# Altium footprint library micro-intel.PCBLIB: 48 footprints (part 4 of 4)
Each footprint in its own frame and in the unit in brackets; x right, y up, seen from the top. Pads: shape width x height; smd on the part's side, far side on the other; paste and mask are expansions set on the pad; w line width, h text height; cw(c..) or ccw(c..) is an arc to the next point about the centre after c.
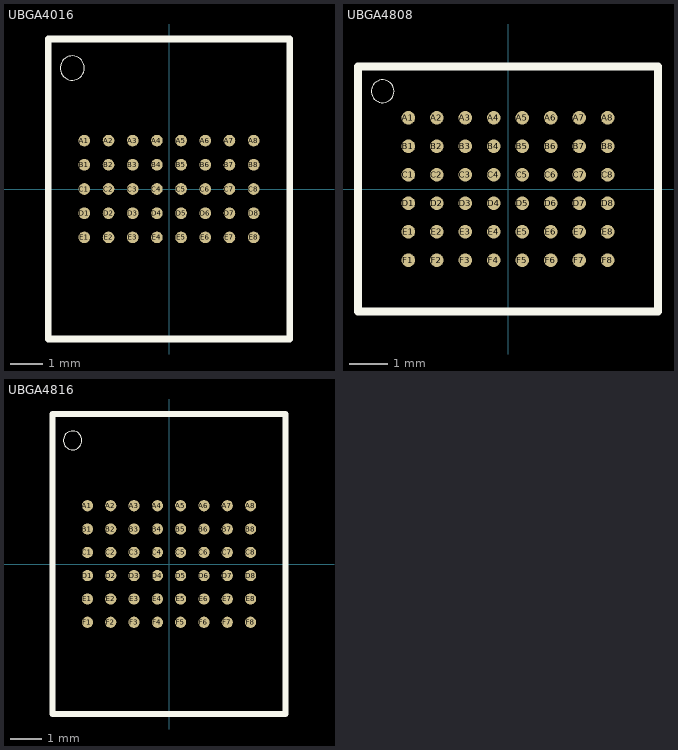
[diagram p3: the footprints below, top view; thin cyan lines are the x and y axes]

## UBGA4016 [mil]
pads (40):
  rrect100% 14.17x14.17 smd: A1(-103.35,59.06) A2(-73.82,59.06) A3(-44.29,59.06) A4(-14.76,59.06) A5(14.76,59.06) A6(44.29,59.06) A7(73.82,59.06) A8(103.35,59.06) B1(-103.35,29.53) B2(-73.82,29.53) B3(-44.29,29.53) B4(-14.76,29.53) B5(14.76,29.53) B6(44.29,29.53) B7(73.82,29.53) B8(103.35,29.53) C1(-103.35,0) C2(-73.82,0) C3(-44.29,0) C4(-14.76,0) C5(14.76,0) C6(44.29,0) C7(73.82,0) C8(103.35,0) D1(-103.35,-29.53) D2(-73.82,-29.53) D3(-44.29,-29.53) D4(-14.76,-29.53) D5(14.76,-29.53) D6(44.29,-29.53) D7(73.82,-29.53) D8(103.35,-29.53) E1(-103.35,-59.06) E2(-73.82,-59.06) E3(-44.29,-59.06) E4(-14.76,-59.06) E5(14.76,-59.06) E6(44.29,-59.06) E7(73.82,-59.06) E8(103.35,-59.06)
Top Overlay:
  circle w0: c-118.11,147.64 r14.76
  lines w8: -147.64,-183.07 147.64,-183.07 147.64,183.07 -147.64,183.07 -147.64,-183.07

## UBGA4808 [mil]
pads (48):
  rrect100% 14.17x14.17 smd: A1(-103.35,73.82) A2(-73.82,73.82) A3(-44.29,73.82) A4(-14.76,73.82) A5(14.76,73.82) A6(44.29,73.82) A7(73.82,73.82) A8(103.35,73.82) B1(-103.35,44.29) B2(-73.82,44.29) B3(-44.29,44.29) B4(-14.76,44.29) B5(14.76,44.29) B6(44.29,44.29) B7(73.82,44.29) B8(103.35,44.29) C1(-103.35,14.76) C2(-73.82,14.76) C3(-44.29,14.76) C4(-14.76,14.76) C5(14.76,14.76) C6(44.29,14.76) C7(73.82,14.76) C8(103.35,14.76) D1(-103.35,-14.76) D2(-73.82,-14.76) D3(-44.29,-14.76) D4(-14.76,-14.76) D5(14.76,-14.76) D6(44.29,-14.76) D7(73.82,-14.76) D8(103.35,-14.76) E1(-103.35,-44.29) E2(-73.82,-44.29) E3(-44.29,-44.29) E4(-14.76,-44.29) E5(14.76,-44.29) E6(44.29,-44.29) E7(73.82,-44.29) E8(103.35,-44.29) F1(-103.35,-73.82) F2(-73.82,-73.82) F3(-44.29,-73.82) F4(-14.76,-73.82) F5(14.76,-73.82) F6(44.29,-73.82) F7(73.82,-73.82) F8(103.35,-73.82)
Top Overlay:
  circle w0: c-129.92,101.38 r11.81
  lines w8: -155.51,-126.97 155.51,-126.97 155.51,126.97 -155.51,126.97 -155.51,-126.97

## UBGA4816 [mil]
pads (48):
  rrect100% 14.17x14.17 smd: A1(-103.35,73.82) A2(-73.82,73.82) A3(-44.29,73.82) A4(-14.76,73.82) A5(14.76,73.82) A6(44.29,73.82) A7(73.82,73.82) A8(103.35,73.82) B1(-103.35,44.29) B2(-73.82,44.29) B3(-44.29,44.29) B4(-14.76,44.29) B5(14.76,44.29) B6(44.29,44.29) B7(73.82,44.29) B8(103.35,44.29) C1(-103.35,14.76) C2(-73.82,14.76) C3(-44.29,14.76) C4(-14.76,14.76) C5(14.76,14.76) C6(44.29,14.76) C7(73.82,14.76) C8(103.35,14.76) D1(-103.35,-14.76) D2(-73.82,-14.76) D3(-44.29,-14.76) D4(-14.76,-14.76) D5(14.76,-14.76) D6(44.29,-14.76) D7(73.82,-14.76) D8(103.35,-14.76) E1(-103.35,-44.29) E2(-73.82,-44.29) E3(-44.29,-44.29) E4(-14.76,-44.29) E5(14.76,-44.29) E6(44.29,-44.29) E7(73.82,-44.29) E8(103.35,-44.29) F1(-103.35,-73.82) F2(-73.82,-73.82) F3(-44.29,-73.82) F4(-14.76,-73.82) F5(14.76,-73.82) F6(44.29,-73.82) F7(73.82,-73.82) F8(103.35,-73.82)
Top Overlay:
  circle w0: c-122.05,156.5 r11.81
  lines w8: -147.64,-189.96 147.64,-189.96 147.64,189.96 -147.64,189.96 -147.64,-189.96